# Altium footprint library clock.PcbLib: 34 footprints (part 2 of 3)
Each footprint in its own frame and in the unit in brackets; x right, y up, seen from the top. Pads: shape width x height; smd on the part's side, far side on the other; paste and mask are expansions set on the pad; w line width, h text height; cw(c..) or ccw(c..) is an arc to the next point about the centre after c.
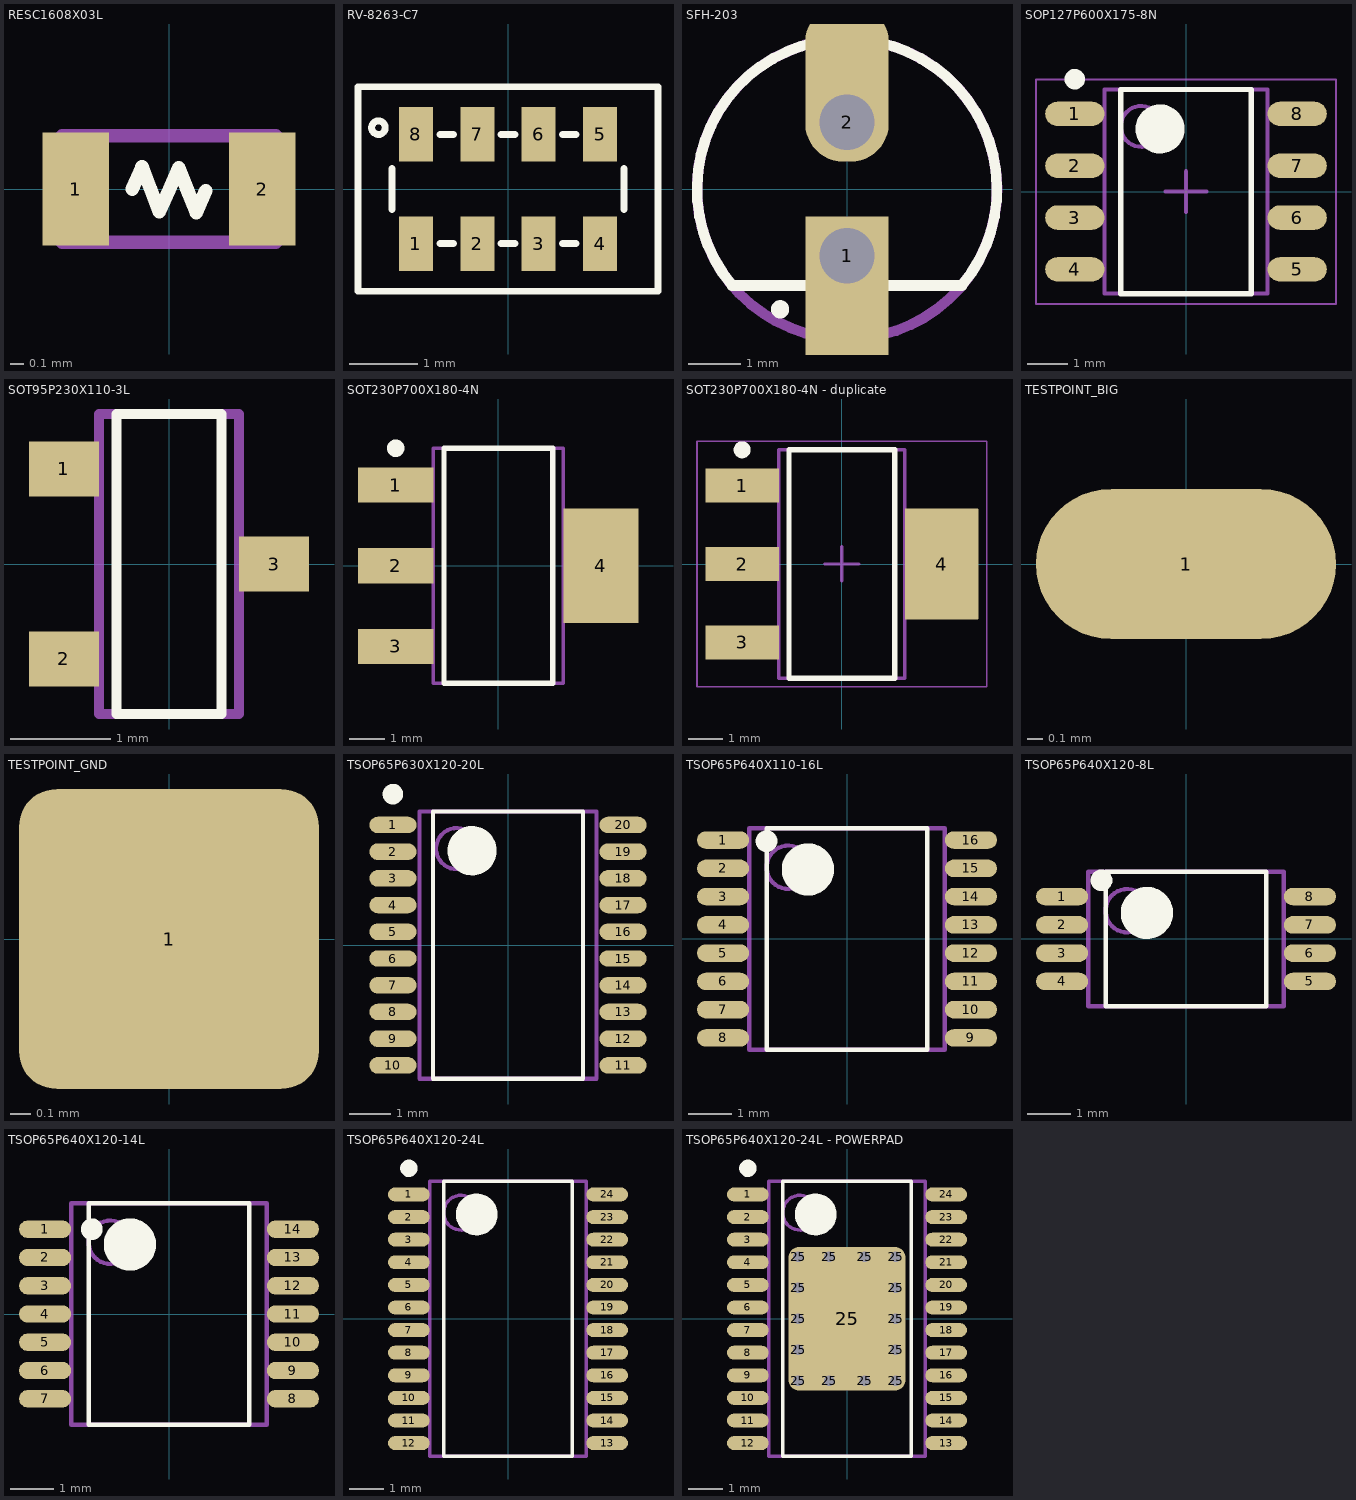
[diagram p1: the footprints below, top view; thin cyan lines are the x and y axes]

## QUARTER_COIN [mm]
3D body "Quarter.STEP": height 1.78, standoff 0, extent -12.166,-0.025 12.167,24.308

## RESC1608X03L [mm] "Chip Resistor, 2-Leads, Body 1.60x0.80mm, IPC High Density"
height 0.3
pads (2):
  rrect1% 0.5x0.85 smd: 1(-0.7,0) 2(0.7,0)
Top Overlay:
  lines w0.102: -0.275,0 -0.203,0.165 -0.137,-0.003 -0.072,-0.171 0.001,-0.006 0.073,0.159 0.139,-0.009 0.204,-0.177 0.277,-0.011
Top Assembly:
  lines w0.1: -0.8,-0.4 0.8,-0.4 0.8,0.4 -0.8,0.4 -0.8,-0.4
3D body "RESC1608X03L.step": height 0.3, standoff 0, extent -0.8,-0.4 0.8,0.4

## RV-8263-C7 [mm]
pads (8):
  rrect1% 0.5x0.8 smd: 1(-1.35,-0.8) 2(-0.45,-0.8) 3(0.45,-0.8) 4(1.35,-0.8) 5(1.35,0.8) 6(0.45,0.8) 7(-0.45,0.8) 8(-1.35,0.8)
Top Overlay:
  circle w0.102: c-1.9,0.9 r0.1
  lines w0.102: -1.7,-0.3 -1.7,0.3 ; -1,-0.8 -0.8,-0.8 ; -1,0.8 -0.8,0.8 ; -0.1,-0.8 0.1,-0.8 ; -0.1,0.8 0.1,0.8 ; 0.8,-0.8 1,-0.8 ; 0.8,0.8 1,0.8 ; 1.7,-0.3 1.7,0.3 ; -2.2,-1.5 2.2,-1.5 2.2,1.5 -2.2,1.5 -2.2,-1.5
3D body "RV-8263-C7 v1.step": height 0.9, standoff 0, extent -1.6,-0.75 1.6,0.75

## SFH-203 [mm] "Photodiode"
pads (2):
  rrect1% 1.58x3 hole 1.05 copper offset 0,-0.75: 1(0,-1.27)
  rrect90% 1.58x3 hole 1.05 copper offset 0,0.75: 2(0,1.27)
Top Overlay:
  circle w0.2: c-1.27,-2.286 r0.072
  lines w0.2: -2.183,-1.832 cw(c0,0) 2.183,-1.832
  lines w0.203: -2.183,-1.832 2.183,-1.832
Mechanical 15:
  circle w0.2: c0,0 r2.85
3D body "LED 5mm.step": height 8.9, standoff -3.59, extent -2.998,-2.5 2.998,3

## SOP127P600X175-8N [mm] "SOP, 8-Leads, Body 4.90x3.90mm, Pitch 1.27mm, IPC Medium Density"
height 1.75
pads (8):
  oval 1.45x0.6 smd: 1(-2.725,1.905) 2(-2.725,0.635) 3(-2.725,-0.635) 4(-2.725,-1.905) 5(2.725,-1.905) 6(2.725,-0.635) 7(2.725,0.635) 8(2.725,1.905)
Top Overlay:
  circle w0.6: c-0.637,1.536 r0.3
  circle w0.25: c-2.725,2.755 r0.125
  lines w0.127: -1.6,-2.5 1.6,-2.5 1.6,2.5 -1.6,2.5 -1.6,-2.5
Top Assembly:
  circle w0.1: c-1.1,1.6 r0.5
  lines w0.1: -2,-2.5 -2,2.5 2,2.5 2,-2.5 -2,-2.5
Mechanical 15:
  lines w0.05: -3.675,-2.75 3.675,-2.75 3.675,2.75 -3.675,2.75 -3.675,-2.75
  lines w0.1: -0.5,0 0.5,0 ; 0,-0.5 0,0.5
3D body "SOP127P600X175-8N.step": height 1.75, standoff 0, extent -3,-2.5 3,2.5

## SOT95P230X110-3L [mm] "SOT23, 3-Leads, Body 2.90x2.30mm, Pitch 0.95mm, IPC High Density"
height 1.1
pads (3):
  rrect1% 0.7x0.55 smd: 1(-1.05,0.95) 2(-1.05,-0.95) 3(1.05,0)
Top Overlay:
  lines w0.102: -0.525,-1.5 -0.525,1.5 0.525,1.5 0.525,-1.5 -0.525,-1.5
Top Assembly:
  lines w0.1: -0.7,-1.5 -0.7,1.5 0.7,1.5 0.7,-1.5 -0.7,-1.5
3D body "SOT95P230X110-3L.step": height 1.1, standoff 0, extent -1.3,-1.5 1.3,1.5

## SOT230P700X180-4N [mm] "SOT223, 4-Leads, Body 6.50x7.00mm (avg), Pitch 2.30mm, IPC Medium Density"
height 1.8
pads (4):
  rrect1% 2.15x1 smd: 1(-2.925,2.3) 2(-2.925,0) 3(-2.925,-2.3)
  rrect1% 2.15x3.25 smd: 4(2.925,0)
Top Overlay:
  circle w0.25: c-2.925,3.35 r0.125
  lines w0.152: -1.55,-3.35 1.55,-3.35 1.55,3.35 -1.55,3.35 -1.55,-3.35
Top Assembly:
  lines w0.1: -1.85,-3.35 -1.85,3.35 1.85,3.35 1.85,-3.35 -1.85,-3.35
3D body "SOT230P700X180-4N.step": height 1.8, standoff 0, extent -3.5,-3.35 3.5,3.35

## SOT230P700X180-4N - duplicate [mm] "LDO 3.3v SOT223 Pitch 2.30mm"
height 1.8
pads (4):
  rrect1% 2.15x1 smd: 1(-2.925,2.3) 2(-2.925,0) 3(-2.925,-2.3)
  rrect1% 2.15x3.25 smd: 4(2.925,0)
Top Overlay:
  circle w0.25: c-2.925,3.35 r0.125
  lines w0.152: -1.55,-3.35 1.55,-3.35 1.55,3.35 -1.55,3.35 -1.55,-3.35
Top Assembly:
  lines w0.1: -1.85,-3.35 -1.85,3.35 1.85,3.35 1.85,-3.35 -1.85,-3.35
Mechanical 15:
  lines w0.05: -4.25,-3.6 4.25,-3.6 4.25,3.6 -4.25,3.6 -4.25,-3.6
  lines w0.1: -0.5,0 0.5,0 ; 0,-0.5 0,0.5
3D body "SOT230P700X180-4N.step": height 1.8, standoff 0, extent -3.5,-3.35 3.5,3.35

## TESTPOINT_BIG [mm] "fatter"
pads (1):
  oval 2x1 smd paste-5: 1(0,0)

## TESTPOINT_GND [mm] "GND"
pads (1):
  rrect25% 1.5x1.5 smd paste-5: 1(0,0)

## TSOP65P630X120-20L [mm] "TSOP, 20-Leads, Body 6.45x4.30mm, Pitch 0.65mm, IPC High Density"
height 1.2
pads (20):
  oval 1.15x0.4 smd: 1(-2.8,2.925) 2(-2.8,2.275) 3(-2.8,1.625) 4(-2.8,0.975) 5(-2.8,0.325) 6(-2.8,-0.325) 7(-2.8,-0.975) 8(-2.8,-1.625) 9(-2.8,-2.275) 10(-2.8,-2.925) 11(2.8,-2.925) 12(2.8,-2.275) 13(2.8,-1.625) 14(2.8,-0.975) 15(2.8,-0.325) 16(2.8,0.325) 17(2.8,0.975) 18(2.8,1.625) 19(2.8,2.275) 20(2.8,2.925)
Top Overlay:
  circle w0.25: c-2.8,3.675 r0.125
  circle w0.6: c-0.874,2.299 r0.3
  lines w0.102: -1.825,-3.25 -1.825,3.25 1.825,3.25 1.825,-3.25 -1.825,-3.25
Top Assembly:
  circle w0.1: c-1.25,2.35 r0.5
  lines w0.1: -2.15,-3.25 -2.15,3.25 2.15,3.25 2.15,-3.25 -2.15,-3.25
3D body "TSOP65P630X120-20L.step": height 1.2, standoff 0, extent -3.15,-3.25 3.15,3.25

## TSOP65P640X110-16L [mm] "TSOP, 16-Leads, Body 5.00x4.40mm, Pitch 0.65mm, IPC High Density"
height 1.1
pads (16):
  oval 1.2x0.4 smd: 1(-2.85,2.275) 2(-2.85,1.625) 3(-2.85,0.975) 4(-2.85,0.325) 5(-2.85,-0.325) 6(-2.85,-0.975) 7(-2.85,-1.625) 8(-2.85,-2.275) 9(2.85,-2.275) 10(2.85,-1.625) 11(2.85,-0.975) 12(2.85,-0.325) 13(2.85,0.325) 14(2.85,0.975) 15(2.85,1.625) 16(2.85,2.275)
Top Overlay:
  circle w0.6: c-0.899,1.599 r0.3
  circle w0.25: c-1.85,2.25 r0.125
  lines w0.102: -1.85,-2.55 1.85,-2.55 1.85,2.55 -1.85,2.55 -1.85,-2.55
Top Assembly:
  circle w0.1: c-1.35,1.65 r0.5
  lines w0.1: -2.25,-2.55 2.25,-2.55 2.25,2.55 -2.25,2.55 -2.25,-2.55
3D body "TSOP65P640X110-16L.step": height 1.1, standoff 0, extent -3.2,-2.55 3.2,2.55

## TSOP65P640X120-8L [mm] "TSOP, 8-Leads, Body 3.00x4.40mm, Pitch 0.65mm, IPC High Density"
height 1.2
pads (8):
  oval 1.2x0.4 smd: 1(-2.85,0.975) 2(-2.85,0.325) 3(-2.85,-0.325) 4(-2.85,-0.975) 5(2.85,-0.975) 6(2.85,-0.325) 7(2.85,0.325) 8(2.85,0.975)
Top Overlay:
  circle w0.25: c-1.943,1.349 r0.125
  circle w0.6: c-0.899,0.599 r0.3
  lines w0.102: -1.85,-1.55 -1.85,1.55 1.85,1.55 1.85,-1.55 -1.85,-1.55
Top Assembly:
  circle w0.1: c-1.35,0.65 r0.5
  lines w0.1: -2.25,-1.55 -2.25,1.55 2.25,1.55 2.25,-1.55 -2.25,-1.55
3D body "TSOP65P640X120-8L.step": height 1.2, standoff 0, extent -3.2,-1.55 3.2,1.55

## TSOP65P640X120-14L [mm] "TSOP, 14-Leads, Body 5.00x4.40mm, Pitch 0.65mm, IPC High Density"
height 1.2
pads (14):
  oval 1.2x0.4 smd: 1(-2.85,1.95) 2(-2.85,1.3) 3(-2.85,0.65) 4(-2.85,0) 5(-2.85,-0.65) 6(-2.85,-1.3) 7(-2.85,-1.95) 8(2.85,-1.95) 9(2.85,-1.3) 10(2.85,-0.65) 11(2.85,0) 12(2.85,0.65) 13(2.85,1.3) 14(2.85,1.95)
Top Overlay:
  circle w0.25: c-1.778,1.95 r0.125
  circle w0.6: c-0.899,1.599 r0.3
  lines w0.102: -1.85,-2.55 -1.85,2.55 1.85,2.55 1.85,-2.55 -1.85,-2.55
Top Assembly:
  circle w0.1: c-1.35,1.65 r0.5
  lines w0.1: -2.25,-2.55 -2.25,2.55 2.25,2.55 2.25,-2.55 -2.25,-2.55
3D body "TSOP65P640X120-14L.step": height 1.2, standoff 0, extent -3.2,-2.55 3.2,2.55

## TSOP65P640X120-24L [mm] "TSOP, 24-Leads, Body 7.80x4.40mm, Pitch 0.65mm, IPC High Density"
height 1.2
pads (24):
  oval 1.2x0.4 smd: 1(-2.85,3.575) 2(-2.85,2.925) 3(-2.85,2.275) 4(-2.85,1.625) 5(-2.85,0.975) 6(-2.85,0.325) 7(-2.85,-0.325) 8(-2.85,-0.975) 9(-2.85,-1.625) 10(-2.85,-2.275) 11(-2.85,-2.925) 12(-2.85,-3.575) 13(2.85,-3.575) 14(2.85,-2.925) 15(2.85,-2.275) 16(2.85,-1.625) 17(2.85,-0.975) 18(2.85,-0.325) 19(2.85,0.325) 20(2.85,0.975) 21(2.85,1.625) 22(2.85,2.275) 23(2.85,2.925) 24(2.85,3.575)
Top Overlay:
  circle w0.25: c-2.85,4.325 r0.125
  circle w0.6: c-0.899,2.999 r0.3
  lines w0.102: -1.85,-3.95 -1.85,3.95 1.85,3.95 1.85,-3.95 -1.85,-3.95
Top Assembly:
  circle w0.1: c-1.35,3.05 r0.5
  lines w0.1: -2.25,-3.95 -2.25,3.95 2.25,3.95 2.25,-3.95 -2.25,-3.95
3D body "TSOP65P640X120-24L.step": height 1.2, standoff 0, extent -3.2,-3.95 3.2,3.95

## TSOP65P640X120-24L - POWERPAD [mm] "TSOP, 24-Leads, Body 7.80x4.40mm, Pitch 0.65mm, IPC High Density"
height 1.2
pads (39):
  oval 1.2x0.4 smd: 1(-2.85,3.575) 2(-2.85,2.925) 3(-2.85,2.275) 4(-2.85,1.625) 5(-2.85,0.975) 6(-2.85,0.325) 7(-2.85,-0.325) 8(-2.85,-0.975) 9(-2.85,-1.625) 10(-2.85,-2.275) 11(-2.85,-2.925) 12(-2.85,-3.575) 13(2.85,-3.575) 14(2.85,-2.925) 15(2.85,-2.275) 16(2.85,-1.625) 17(2.85,-0.975) 18(2.85,-0.325) 19(2.85,0.325) 20(2.85,0.975) 21(2.85,1.625) 22(2.85,2.275) 23(2.85,2.925) 24(2.85,3.575)
  round 0.56 hole 0.3 mask+0.102: 25(-1.397,-1.778) 25(-1.397,-0.889) 25(-1.397,0) 25(-1.397,0.889) 25(-1.397,1.778) 25(-0.508,-1.778) 25(-0.508,1.778) 25(0.508,-1.778) 25(0.508,1.778) 25(1.397,-1.778) 25(1.397,-0.889) 25(1.397,0) 25(1.397,0.889) 25(1.397,1.778)
  rrect17% 3.355x4.12 smd mask+0.102: 25(0,0)
Top Overlay:
  circle w0.6: c-0.899,2.999 r0.3
  circle w0.25: c-2.85,4.325 r0.125
  lines w0.102: -1.85,-3.95 1.85,-3.95 1.85,3.95 -1.85,3.95 -1.85,-3.95
Top Solder:
  region: -1.15,-1.5 -1.15,1.5 1.15,1.5 1.15,-1.5
Top Assembly:
  circle w0.1: c-1.35,3.05 r0.5
  lines w0.1: -2.25,-3.95 2.25,-3.95 2.25,3.95 -2.25,3.95 -2.25,-3.95
3D body "TSOP65P640X120-24L.step": height 1.2, standoff 0, extent -3.2,-3.95 3.2,3.95